# Altium footprint library 6-Connectors-1.PcbLib: 54 footprints (part 4 of 5)
Each footprint in its own frame and in the unit in brackets; x right, y up, seen from the top. Pads: shape width x height; smd on the part's side, far side on the other; paste and mask are expansions set on the pad; w line width, h text height; cw(c..) or ccw(c..) is an arc to the next point about the centre after c.
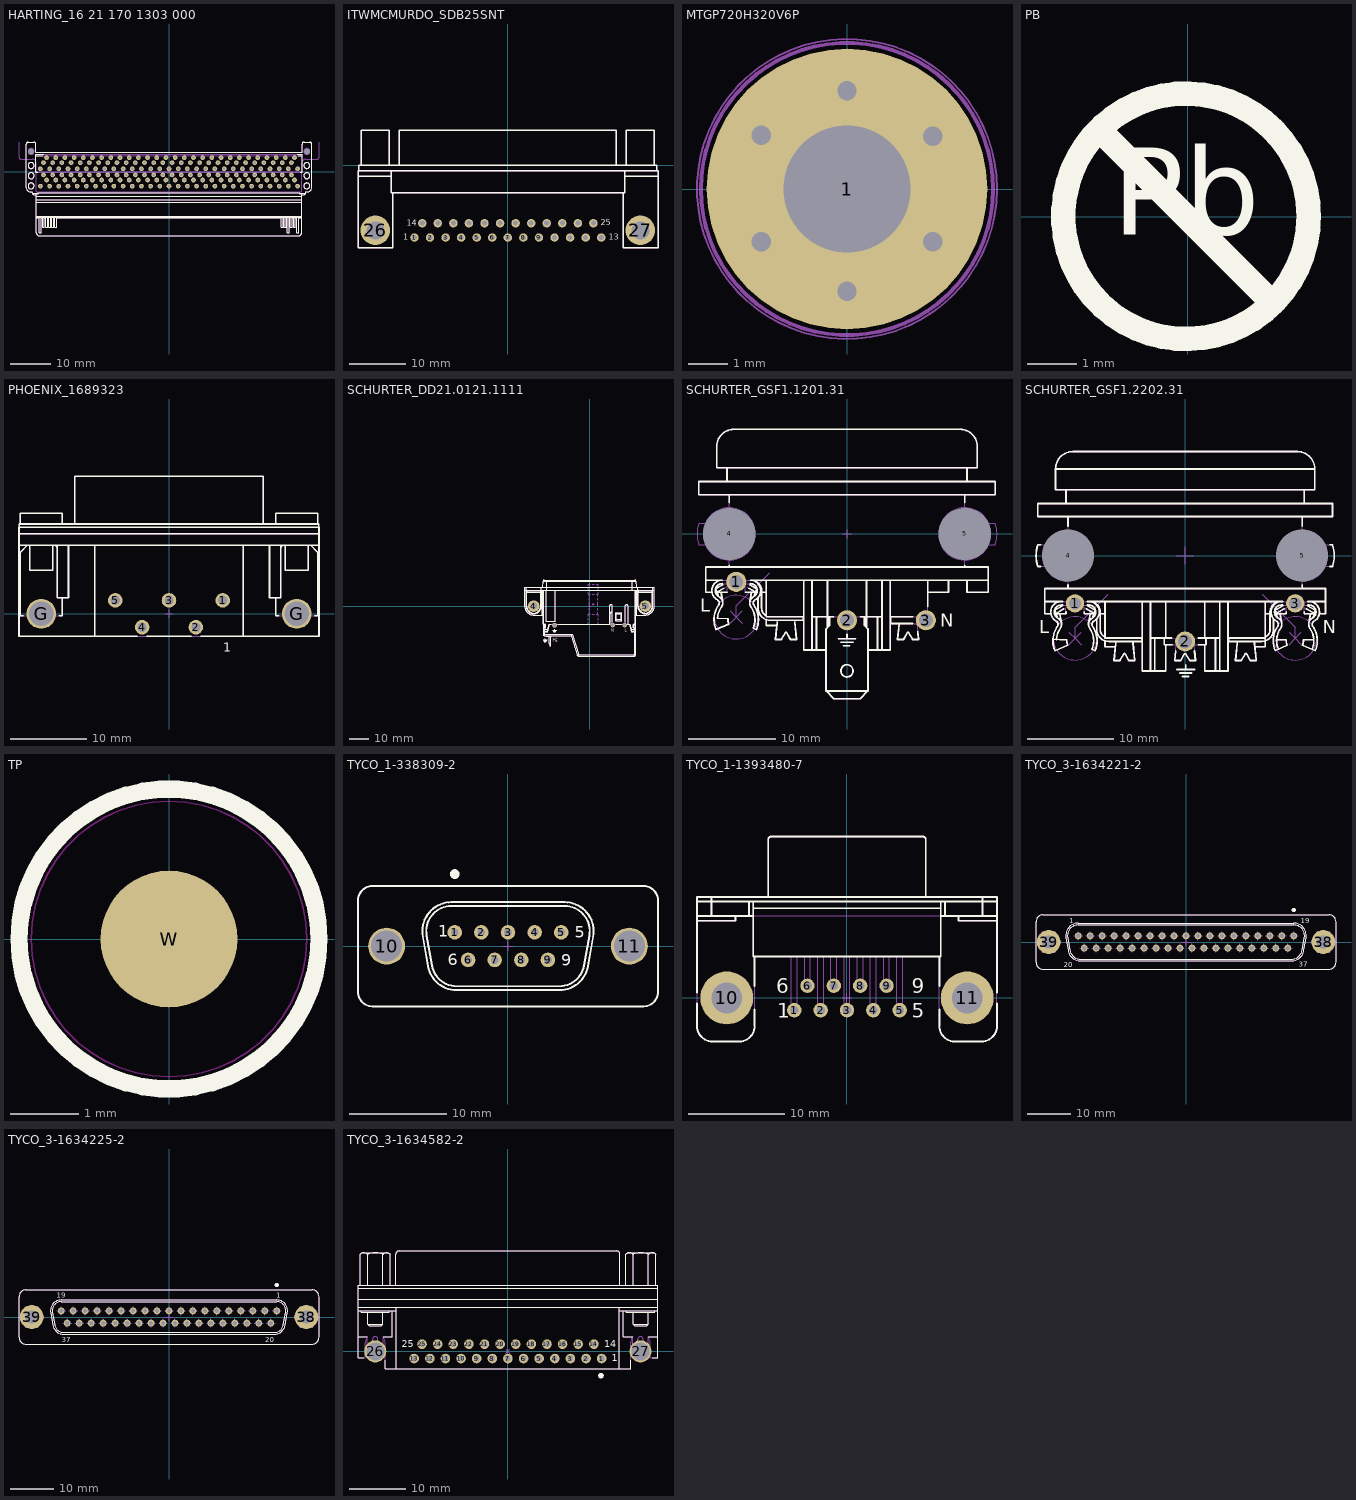
[diagram p3: the footprints below, top view; thin cyan lines are the x and y axes]

## HARTING_16 21 170 1303 000 [mm] "170 Poles, Extended Side, AdvancedMC-Plug-Connector"
height 2.44
pads (172):
  round 1.15 hole 0.55: 1(-31.5,-3.5) 2(-30.75,-0.75) 3(-30,-2) 4(-29.25,-3.5) 5(-28.5,-0.75) 6(-27.75,-2) 7(-27,-3.5) 8(-26.25,-0.75) 9(-25.5,-2) 10(-24.75,-3.5) 11(-24,-0.75) 12(-23.25,-2) 13(-22.5,-3.5) 14(-21.75,-0.75) 15(-21,-2) 16(-20.25,-3.5) 17(-19.5,-0.75) 18(-18.75,-2) 19(-18,-3.5) 20(-17.25,-0.75) 21(-16.5,-2) 22(-15.75,-3.5) 23(-15,-0.75) 24(-14.25,-2) 25(-13.5,-3.5) 26(-12.75,-0.75) 27(-12,-2) 28(-11.25,-3.5) 29(-10.5,-0.75) 30(-9.75,-2) 31(-9,-3.5) 32(-8.25,-0.75) 33(-7.5,-2) 34(-6.75,-3.5) 35(-6,-0.75) 36(-5.25,-2) 37(-4.5,-3.5) 38(-3.75,-0.75) 39(-3,-2) 40(-2.25,-3.5) 41(-1.5,-0.75) 42(-0.75,-2) 43(0,-3.5) 44(0.75,-0.75) 45(1.5,-2) 46(2.25,-3.5) 47(3,-0.75) 48(3.75,-2) 49(4.5,-3.5) 50(5.25,-0.75) 51(6,-2) 52(6.75,-3.5) 53(7.5,-0.75) 54(8.25,-2) 55(9,-3.5) 56(9.75,-0.75) 57(10.5,-2) 58(11.25,-3.5) 59(12,-0.75) 60(12.75,-2) 61(13.5,-3.5) 62(14.25,-0.75) 63(15,-2) 64(15.75,-3.5) 65(16.5,-0.75) 66(17.25,-2) 67(18,-3.5) 68(18.75,-0.75) 69(19.5,-2) 70(20.25,-3.5) 71(21,-0.75) 72(21.75,-2) 73(22.5,-3.5) 74(23.25,-0.75) 75(24,-2) 76(24.75,-3.5) 77(25.5,-0.75) 78(26.25,-2) 79(27,-3.5) 80(27.75,-0.75) 81(28.5,-2) 82(29.25,-3.5) 83(30,-0.75) 84(30.75,-2) 85(31.5,-3.5) 86(31.5,0.75) 87(30.75,3.5) 88(30,2.25) 89(29.25,0.75) 90(28.5,3.5) 91(27.75,2.25) 92(27,0.75) 93(26.25,3.5) 94(25.5,2.25) 95(24.75,0.75) 96(24,3.5) 97(23.25,2.25) 98(22.5,0.75) 99(21.75,3.5) 100(21,2.25) 101(20.25,0.75) 102(19.5,3.5) 103(18.75,2.25) 104(18,0.75) 105(17.25,3.5) 106(16.5,2.25) 107(15.75,0.75) 108(15,3.5) 109(14.25,2.25) 110(13.5,0.75) 111(12.75,3.5) 112(12,2.25) 113(11.25,0.75) 114(10.5,3.5) 115(9.75,2.25) 116(9,0.75) 117(8.25,3.5) 118(7.5,2.25) 119(6.75,0.75) 120(6,3.5) 121(5.25,2.25) 122(4.5,0.75) 123(3.75,3.5) 124(3,2.25) 125(2.25,0.75) 126(1.5,3.5) 127(0.75,2.25) 128(0,0.75) 129(-0.75,3.5) 130(-1.5,2.25) 131(-2.25,0.75) 132(-3,3.5) 133(-3.75,2.25) 134(-4.5,0.75) 135(-5.25,3.5) 136(-6,2.25) 137(-6.75,0.75) 138(-7.5,3.5) 139(-8.25,2.25) 140(-9,0.75) 141(-9.75,3.5) 142(-10.5,2.25) 143(-11.25,0.75) 144(-12,3.5) 145(-12.75,2.25) 146(-13.5,0.75) 147(-14.25,3.5) 148(-15,2.25) 149(-15.75,0.75) 150(-16.5,3.5) 151(-17.25,2.25) 152(-18,0.75) 153(-18.75,3.5) 154(-19.5,2.25) 155(-20.25,0.75) 156(-21,3.5) 157(-21.75,2.25) 158(-22.5,0.75) 159(-23.25,3.5) 160(-24,2.25) 161(-24.75,0.75) 162(-25.5,3.5) 163(-26.25,2.25) 164(-27,0.75) 165(-27.75,3.5) 166(-28.5,2.25) 167(-29.25,0.75) 168(-30,3.5) 169(-30.75,2.25) 170(-31.5,0.75)
  round 1 hole 1.5 unplated mask+0.25: 171(-33.775,5) 172(33.775,5)
Top Overlay:
  circle w0.2: c33.775,1.55 r0.735
  circle w0.2: c33.775,-0.95 r0.735
  circle w0.2: c33.775,-3.45 r0.735
  circle w0.2: c-33.775,-3.45 r0.735
  circle w0.2: c-33.775,-0.95 r0.735
  circle w0.2: c-33.775,1.55 r0.735
  lines w0.2: -33.49,-5.2 -31.99,-5.2 ; -32.6,0.078 -32.307,0.078 ; -32.6,3.922 -30.961,3.922 ; -32.525,-11.2 -31.74,-11.2 ; -32.525,-11.068 32.525,-11.068 ; -32.525,-10.935 32.525,-10.935 ; -32.525,-7.4 32.525,-7.4 ; -32.525,-6.872 32.525,-6.872 ; -32.525,-6.009 32.525,-6.009 ; -32.525,-5.6 -33,-5.6 cw(c-33,-5.1) -33.5,-5.1 -33.5,-4.9 -33.95,-4.9 cw(c-33.95,-3.9) -34.95,-3.9 -34.95,6.8 cw(c-34.45,6.8) -34.45,7.3 -33.1,7.3 cw(c-33.1,6.8) -32.6,6.8 -32.6,4.8 32.6,4.8 32.6,6.8 cw(c33.1,6.8) 33.1,7.3 34.45,7.3 cw(c34.45,6.8) 34.95,6.8 34.95,-3.9 cw(c33.95,-3.9) 33.95,-4.9 33.5,-4.9 33.49,-5.2 31.99,-5.2 ; -32.18,-0.05 -32.6,-0.05 -32.6,4.3 -30.68,4.3 ; -31.74,-11.068 -31.74,-14.98 -31.26,-14.98 -31.26,-11.068 ; -31.26,-11.2 -30.99,-11.2 ; -30.99,-11.068 -30.99,-13.58 -30.51,-13.58 -30.51,-11.068 ; -30.51,-11.2 -30.24,-11.2 ; -30.24,-11.068 -30.24,-13.58 -29.76,-13.58 -29.76,-11.068 ; -29.76,-11.2 -29.49,-11.2 ; -29.49,-11.068 -29.49,-13.58 -29.01,-13.58 -29.01,-11.068 ; -29.01,-11.2 -28.74,-11.2 ; -28.74,-11.068 -28.74,-13.58 -28.26,-13.58 -28.26,-11.068 ; -28.26,-11.2 -27.99,-11.2 ; -27.99,-11.068 -27.99,-13.58 -27.51,-13.58 -27.51,-11.068 ; -27.51,-11.2 27.51,-11.2 ; 27.51,-11.068 27.51,-13.58 27.99,-13.58 27.99,-11.068 ; 27.99,-11.2 28.26,-11.2 ; 28.26,-11.068 28.26,-13.58 28.74,-13.58 28.74,-11.068 ; 28.74,-11.2 29.01,-11.2 ; 29.01,-11.068 29.01,-14.98 29.49,-14.98 29.49,-11.068 ; 29.49,-11.2 29.76,-11.2 ; 29.76,-11.068 29.76,-13.58 30.24,-13.58 30.24,-11.068 ; 30.24,-11.2 30.51,-11.2 ; 30.51,-11.068 30.51,-13.58 30.99,-13.58 30.99,-11.068 ; 30.99,-11.2 31.26,-11.2 ; 31.26,-11.068 31.26,-14.98 31.74,-14.98 31.74,-11.068 ; 31.43,4.3 32.6,4.3 32.6,-0.05 32.18,-0.05 ; 31.711,3.922 32.6,3.922 ; 31.74,-11.2 32.525,-11.2 ; 32.026,-15.594 32.379,-15.246 ccw(c32.025,-14.893) 32.525,-14.893 32.525,-5.377 ; 32.049,-15.574 cw(c31.718,-15.2) 31.718,-15.7 -31.718,-15.7 cw(c-31.718,-15.2) -32.026,-15.594 -32.379,-15.246 cw(c-32.025,-14.893) -32.525,-14.893 -32.525,-5.377 -31.99,-5.359 -31.99,-5.093 31.99,-5.093 31.99,-5.359 32.525,-5.359 ; 32.308,0.079 32.6,0.079 ; 32.525,-5.6 33,-5.6 ccw(c33,-5.1) 33.5,-5.1
Mechanical 8:
  drawing of 704 lines, arcs and shapes, not listed
  text "PCB Edge" at -5.225,-7 h1.52
Mechanical 14:
  circle w0.1: c33.775,5 r0.735
  circle w0.1: c-33.775,5 r0.735
  circle w0.1: c33.775,1.55 r0.735
  circle w0.1: c33.775,-0.95 r0.735
  circle w0.1: c33.775,-3.45 r0.735
  circle w0.1: c-33.775,-3.45 r0.735
  circle w0.1: c-33.775,-0.95 r0.735
  circle w0.1: c-33.775,1.55 r0.735
  lines w0.1: -33.49,-5.2 -31.99,-5.2 ; -32.6,0.078 32.6,0.079 ; -32.6,3.922 32.6,3.922 ; -32.525,-11.2 -31.74,-11.2 ; -32.525,-11.068 32.525,-11.068 ; -32.525,-10.935 32.525,-10.935 ; -32.525,-7.4 32.525,-7.4 ; -32.525,-6.872 32.525,-6.872 ; -32.525,-6.009 32.525,-6.009 ; -32.525,-5.6 -33,-5.6 cw(c-33,-5.1) -33.5,-5.1 -33.5,-4.9 -33.95,-4.9 cw(c-33.95,-3.9) -34.95,-3.9 -34.95,6.8 cw(c-34.45,6.8) -34.45,7.3 -33.1,7.3 cw(c-33.1,6.8) -32.6,6.8 -32.6,4.8 32.6,4.8 32.6,6.8 cw(c33.1,6.8) 33.1,7.3 34.45,7.3 cw(c34.45,6.8) 34.95,6.8 34.95,-3.9 cw(c33.95,-3.9) 33.95,-4.9 33.5,-4.9 33.49,-5.2 31.99,-5.2 ; -31.74,-11.068 -31.74,-14.98 -31.26,-14.98 -31.26,-11.068 ; -31.26,-11.2 -30.99,-11.2 ; -30.99,-11.068 -30.99,-13.58 -30.51,-13.58 -30.51,-11.068 ; -30.51,-11.2 -30.24,-11.2 ; -30.24,-11.068 -30.24,-13.58 -29.76,-13.58 -29.76,-11.068 ; -29.76,-11.2 -29.49,-11.2 ; -29.49,-11.068 -29.49,-13.58 -29.01,-13.58 -29.01,-11.068 ; -29.01,-11.2 -28.74,-11.2 ; -28.74,-11.068 -28.74,-13.58 -28.26,-13.58 -28.26,-11.068 ; -28.26,-11.2 -27.99,-11.2 ; -27.99,-11.068 -27.99,-13.58 -27.51,-13.58 -27.51,-11.068 ; -27.51,-11.2 27.51,-11.2 ; 27.51,-11.068 27.51,-13.58 27.99,-13.58 27.99,-11.068 ; 27.99,-11.2 28.26,-11.2 ; 28.26,-11.068 28.26,-13.58 28.74,-13.58 28.74,-11.068 ; 28.74,-11.2 29.01,-11.2 ; 29.01,-11.068 29.01,-14.98 29.49,-14.98 29.49,-11.068 ; 29.49,-11.2 29.76,-11.2 ; 29.76,-11.068 29.76,-13.58 30.24,-13.58 30.24,-11.068 ; 30.24,-11.2 30.51,-11.2 ; 30.51,-11.068 30.51,-13.58 30.99,-13.58 30.99,-11.068 ; 30.99,-11.2 31.26,-11.2 ; 31.26,-11.068 31.26,-14.98 31.74,-14.98 31.74,-11.068 ; 31.74,-11.2 32.525,-11.2 ; 32.026,-15.594 32.379,-15.246 ccw(c32.025,-14.893) 32.525,-14.893 32.525,-5.377 ; 32.049,-15.574 cw(c31.718,-15.2) 31.718,-15.7 -31.718,-15.7 cw(c-31.718,-15.2) -32.026,-15.594 -32.379,-15.246 cw(c-32.025,-14.893) -32.525,-14.893 -32.525,-5.377 -31.99,-5.359 -31.99,-5.093 31.99,-5.093 31.99,-5.359 32.525,-5.359 ; 32.525,-5.6 33,-5.6 ccw(c33,-5.1) 33.5,-5.1 ; -32.6,-0.05 -32.6,4.3 32.6,4.3 32.6,-0.05 -32.6,-0.05
3D body "HARTING_16 21 170 1303 000.stp": height 2.42, standoff -2.18, extent -34.95,-15.7 34.95,7.3

## ITWMCMURDO_SDB25SNT [mm] "25 Way Right Angled Female D-sub Connector"
height 12.5
pads (27):
  round 1.5 hole 0.9: 1(-16.56,-12.84) 2(-13.8,-12.84) 3(-11.04,-12.84) 4(-8.28,-12.84) 5(-5.52,-12.84) 6(-2.76,-12.84) 7(0,-12.84) 8(2.76,-12.84) 9(5.52,-12.84) 10(8.28,-12.84) 11(11.04,-12.84) 12(13.8,-12.84) 13(16.56,-12.84) 14(-15.18,-10.3) 15(-12.42,-10.3) 16(-9.66,-10.3) 17(-6.9,-10.3) 18(-4.14,-10.3) 19(-1.38,-10.3) 20(1.38,-10.3) 21(4.14,-10.3) 22(6.9,-10.3) 23(9.66,-10.3) 24(12.42,-10.3) 25(15.18,-10.3)
  round 5.25 hole 3.2: 26(-23.5,-11.57) 27(23.5,-11.57)
Top Overlay:
  lines w0.254: -26.571,-2 -20.671,-2 ; -26.45,-1 -26.45,0 26.45,0 26.45,-1 ; -26,0 -26,6.2 -21,6.2 -21,0 ; -20.671,-1 -20.671,-4.9 20.729,-4.9 20.729,-1 ; -20.371,-4.9 -20.371,-14.67 -26.571,-14.67 -26.571,-1 26.629,-1 26.629,-14.67 20.429,-14.67 20.429,-4.9 ; -19.25,0 -19.25,6.2 19.25,6.2 19.25,0 ; 20.729,-2 26.629,-2 ; 21,0 21,6.2 26,6.2 26,0
  text "1" at -18.542,-13.208 h1.02
  text "13" at 17.907,-13.208 h1.02
  text "14" at -17.907,-10.795 h1.02
  text "25" at 16.51,-10.668 h1.02
Mechanical 14:
  lines w0.1: -26.571,-2 -20.671,-2 ; -26.45,-1 -26.45,0 26.45,0 26.45,-1 ; -26,0 -26,6.2 -21,6.2 -21,0 ; -20.671,-1 -20.671,-4.9 20.729,-4.9 20.729,-1 ; -20.371,-4.9 -20.371,-14.67 -26.571,-14.67 -26.571,-1 26.629,-1 26.629,-14.67 20.429,-14.67 20.429,-4.9 ; -19.25,0 -19.25,6.2 19.25,6.2 19.25,0 ; 20.729,-2 26.629,-2 ; 21,0 21,6.2 26,6.2 26,0
  text "1" at -18.542,-13.208 h1.02
  text "13" at 17.907,-13.208 h1.02
  text "14" at -17.907,-10.795 h1.02
  text "25" at 16.51,-10.668 h1.02
3D body "v160-080.stp": height 0.02, standoff -1.65, extent 14.38,-11.1 15.98,-9.5
3D body "v160-080.stp": height 0.02, standoff -1.65, extent 15.76,-13.64 17.36,-12.04
3D body "v160-080.stp": height 0.02, standoff -1.65, extent 13,-13.64 14.6,-12.04
3D body "v160-080.stp": height 0.02, standoff -1.65, extent 11.62,-11.1 13.22,-9.5
3D body "v160-080.stp": height 0.02, standoff -1.65, extent 10.24,-13.64 11.84,-12.04
3D body "v160-080.stp": height 0.02, standoff -1.65, extent 8.86,-11.1 10.46,-9.5
3D body "v160-080.stp": height 0.02, standoff -1.65, extent 7.48,-13.64 9.08,-12.04
3D body "v160-080.stp": height 0.02, standoff -1.65, extent 6.1,-11.1 7.7,-9.5
3D body "v160-080.stp": height 0.02, standoff -1.65, extent 4.72,-13.64 6.32,-12.04
3D body "v160-080.stp": height 0.02, standoff -1.65, extent 3.34,-11.1 4.94,-9.5
3D body "v160-080.stp": height 0.02, standoff -1.65, extent 1.96,-13.64 3.56,-12.04
3D body "v160-080.stp": height 0.02, standoff -1.65, extent 0.58,-11.1 2.18,-9.5
3D body "v160-080.stp": height 0.02, standoff -1.65, extent -0.8,-13.64 0.8,-12.04
3D body "v160-080.stp": height 0.02, standoff -1.65, extent -2.18,-11.1 -0.58,-9.5
3D body "v160-080.stp": height 0.02, standoff -1.65, extent -3.56,-13.64 -1.96,-12.04
3D body "v160-080.stp": height 0.02, standoff -1.65, extent -4.94,-11.1 -3.34,-9.5
3D body "v160-080.stp": height 0.02, standoff -1.65, extent -6.32,-13.64 -4.72,-12.04
3D body "v160-080.stp": height 0.02, standoff -1.65, extent -7.7,-11.1 -6.1,-9.5
3D body "v160-080.stp": height 0.02, standoff -1.65, extent -9.08,-13.64 -7.48,-12.04
3D body "v160-080.stp": height 0.02, standoff -1.65, extent -10.46,-11.1 -8.86,-9.5
3D body "v160-080.stp": height 0.02, standoff -1.65, extent -13.22,-11.1 -11.62,-9.5
3D body "v160-080.stp": height 0.02, standoff -1.65, extent -11.84,-13.64 -10.24,-12.04
3D body "v160-080.stp": height 0.02, standoff -1.65, extent -14.6,-13.64 -13,-12.04
3D body "v160-080.stp": height 0.02, standoff -1.65, extent -17.36,-13.64 -15.76,-12.04
3D body "v160-080.stp": height 0.02, standoff -1.65, extent -15.98,-11.1 -14.38,-9.5
3D body "ITWMCMURDO_SDB25SNT.stp": height 12.93, standoff -5, extent -26.71,-14.67 26.71,6.2

## MTGP720H320V6P [mm]
pads (1):
  round 7.2 hole 3.25: 1(0,0)
via -2.2,-1.35 diameter 1 hole 0.5
via -2.2,1.375 diameter 1 hole 0.5
via 0,2.525 diameter 1 hole 0.5
via 2.2,1.35 diameter 1 hole 0.5
via 0,-2.625 diameter 1 hole 0.5
via 2.2,-1.35 diameter 1 hole 0.5
Mechanical 8:
  circle w0.1: c0,0 r2.6
  circle w0.1: c0,0 r3.75
  lines w0.1: -2.657,1.625 -2.224,1.375 ; -2.632,-1.6 -2.199,-1.35 ; -2.474,0.942 -2.224,1.375 ; -2.449,-0.917 -2.199,-1.35 ; -1.974,1.808 -2.224,1.375 ; -1.949,-1.783 -2.199,-1.35 ; -1.791,1.125 -2.224,1.375 ; -1.766,-1.1 -2.199,-1.35 ; -0.5,-2.625 0,-2.625 ; -0.5,0 0,0 ; -0.5,2.525 0,2.525 ; 0,-3.125 0,-2.625 ; 0,-2.125 0,-2.625 ; 0,-0.5 0,0 ; 0,0.5 0,0 ; 0,2.025 0,2.525 ; 0,3.025 0,2.525 ; 0.5,-2.625 0,-2.625 ; 0.5,0 0,0 ; 0.5,2.525 0,2.525 ; 1.766,-1.1 2.199,-1.35 ; 1.766,1.1 2.199,1.35 ; 1.949,-1.783 2.199,-1.35 ; 1.949,1.783 2.199,1.35 ; 2.449,-0.917 2.199,-1.35 ; 2.449,0.917 2.199,1.35 ; 2.632,-1.6 2.199,-1.35 ; 2.632,1.6 2.199,1.35
Mechanical 14:
  circle w0.1: c0,0 r3.75
Mechanical 15:
  circle w0.05: c0,0 r3.85
3D body "mtgp720h320v6p.stp": height 0.1, standoff -1.75, extent -3.627,-3.627 3.628,3.628

## PB [mm]
Top Overlay:
  circle w0.5: c-0.031,0.013 r2.5
  lines w0.5: -1.737,1.719 1.675,-1.693
  text "Pb" at -1.536,-0.948 h3.05
3D body "pb.stp": height 0.02, standoff 0, extent -2.725,-2.725 2.725,2.725

## PHOENIX_1689323 [mm] "Pitch 3.5mm, 5-Positions POWER-SUBCON Shielded Header, With Capacitive  Ground Connection"
height 13.7
pads (7):
  round 1.9 hole 1.2: 1(7,1.75) 2(3.5,-1.75) 3(0,1.75) 4(-3.5,-1.75) 5(-7,1.75)
  round 3.9 hole 3.2: G(-16.65,0) G(16.65,0)
Top Overlay:
  lines w0.2: -19.55,8.95 19.55,8.95 ; -19.55,10.45 19.55,10.45 ; -19.54,11.25 -19.54,11.7 19.54,11.7 19.54,11.25 ; -19.4,11.7 -19.4,13.105 -13.9,13.105 -13.9,11.7 ; -18.984,-0.275 -19.4,-0.275 -19.4,8 -18.45,8.95 ; -18.15,8.95 -18.15,5.7 -15.15,5.7 -15.15,8.95 ; -14.85,8.95 -14.55,8.65 ; -14.55,8.95 -14.55,2.1 -13.1,2.1 -13.1,8.95 ; -14.316,-0.275 -13.9,-0.275 -13.9,2.1 ; -12.299,11.7 -12.299,17.9 ; -12.26,17.9 12.299,17.9 12.299,11.7 ; -9.7,-2.95 -9.7,8.95 ; -4.118,-2.95 -19.55,-2.95 -19.55,11.25 19.55,11.25 19.55,-2.95 4.118,-2.95 ; -2.882,-2.95 2.882,-2.95 ; 9.7,-2.95 9.7,8.95 ; 13.1,8.95 13.1,2.1 14.55,2.1 14.55,8.95 ; 13.9,2.1 13.9,-0.275 14.316,-0.275 ; 13.9,11.7 13.9,13.105 19.4,13.105 19.4,11.7 ; 14.55,8.65 14.85,8.95 ; 15.15,8.95 15.15,5.7 18.15,5.7 18.15,8.95 ; 18.45,8.95 19.4,8 19.4,-0.275 18.984,-0.275
  text "1" at 7.05,-4.925 h1.2
Mechanical 8:
  lines w0.1: -17.15,0 -16.65,0 ; -16.65,-0.5 -16.65,0 ; -16.65,0.5 -16.65,0 ; -16.15,0 -16.65,0 ; -7.5,1.75 -7,1.75 ; -7,1.25 -7,1.75 ; -7,2.25 -7,1.75 ; -6.5,1.75 -7,1.75 ; -4,-1.75 -3.5,-1.75 ; -3.5,-2.25 -3.5,-1.75 ; -3.5,-1.25 -3.5,-1.75 ; -3,-1.75 -3.5,-1.75 ; -0.5,0 0,0 ; -0.5,1.75 0,1.75 ; 0,-0.5 0,0 ; 0,0.5 0,0 ; 0,1.25 0,1.75 ; 0,2.25 0,1.75 ; 0.5,0 0,0 ; 0.5,1.75 0,1.75 ; 3,-1.75 3.5,-1.75 ; 3.5,-2.25 3.5,-1.75 ; 3.5,-1.25 3.5,-1.75 ; 4,-1.75 3.5,-1.75 ; 6.5,1.75 7,1.75 ; 7,1.25 7,1.75 ; 7,2.25 7,1.75 ; 7.5,1.75 7,1.75 ; 16.15,0 16.65,0 ; 16.65,-0.5 16.65,0 ; 16.65,0.5 16.65,0 ; 17.15,0 16.65,0
Mechanical 14:
  lines w0.1: -19.55,8.95 19.55,8.95 ; -19.55,10.45 19.55,10.45 ; -19.54,11.25 -19.54,11.7 19.54,11.7 19.54,11.25 ; -19.4,11.7 -19.4,13.105 -13.9,13.105 -13.9,11.7 ; -18.45,8.95 -19.4,8 -19.4,-0.275 -13.9,-0.275 -13.9,2.1 ; -18.15,8.95 -18.15,5.7 -15.15,5.7 -15.15,8.95 ; -14.85,8.95 -14.55,8.65 ; -14.55,8.95 -14.55,2.1 -13.1,2.1 -13.1,8.95 ; -12.299,11.7 -12.299,17.9 ; -12.26,17.9 12.299,17.9 12.299,11.7 ; -9.7,-2.95 -9.7,8.95 ; 9.7,-2.95 9.7,8.95 ; 13.1,8.95 13.1,2.1 14.55,2.1 14.55,8.95 ; 13.9,2.1 13.9,-0.275 19.4,-0.275 19.4,8 18.45,8.95 ; 13.9,11.7 13.9,13.105 19.4,13.105 19.4,11.7 ; 14.55,8.65 14.85,8.95 ; 15.15,8.95 15.15,5.7 18.15,5.7 18.15,8.95 ; -19.55,-2.95 19.55,-2.95 19.55,11.25 -19.55,11.25 -19.55,-2.95
  text "1" at 7.05,-4.925 h1.2
3D body "PHOENIX_1689323.stp": height 13.65, standoff -4.1, extent -19.55,-3.331 19.55,17.519

## SCHURTER_DD21.0121.1111 [mm] "IEC Appliance Inlet C14 with Line Switch 2-Pole, Fuseholder 2-Pole, for PCB Mounting"
height 32.3
pads (5):
  round 2.2 hole 1.5: 1(17.65,-9.55) 3(11.65,-9.55)
  round 2.4 hole 1.7: 2(-17.55,-9.55)
  round 5.8 hole 3.4: 4(-28,0)
  round 5.8 hole 3.4 unplated: 5(28,0)
Top Overlay:
  drawing of 222 lines, arcs and shapes, not listed
  text "L" at 17.578,-12.875 h1.5
  text "N" at 11.025,-12.95 h1.5
  text "PE" at -18.375,-17.975 h1.5
Mechanical 8:
  circle w0.1: c17.65,-9.55 r0.65
  circle w0.1: c11.65,-9.55 r0.65
  circle w0.1: c-17.55,-9.55 r0.8
  circle w0.1: c28,0 r1.8
  circle w0.1: c-28,0 r1.8
  lines w0.1: -28.5,0 -28,0 ; -28,-0.5 -28,0 ; -28,0.5 -28,0 ; -27.5,0 -28,0 ; -18.05,-9.55 -17.55,-9.55 ; -17.55,-10.05 -17.55,-9.55 ; -17.55,-9.05 -17.55,-9.55 ; -17.05,-9.55 -17.55,-9.55 ; -0.5,0 0,0 ; 0,-0.5 0,0 ; 0,0.5 0,0 ; 0.5,0 0,0 ; 1.45,0.95 1.95,0.95 ; 1.95,0.45 1.95,0.95 ; 1.95,1.45 1.95,0.95 ; 2.45,0.95 1.95,0.95 ; 11.15,-9.55 11.65,-9.55 ; 11.65,-10.05 11.65,-9.55 ; 11.65,-9.05 11.65,-9.55 ; 12.15,-9.55 11.65,-9.55 ; 17.15,-9.55 17.65,-9.55 ; 17.65,-10.05 17.65,-9.55 ; 17.65,-9.05 17.65,-9.55 ; 18.15,-9.55 17.65,-9.55 ; 27.5,0 28,0 ; 28,-0.5 28,0 ; 28,0.5 28,0 ; 28.5,0 28,0
Mechanical 14:
  drawing of 258 lines, arcs and shapes, not listed
  text "L" at 17.578,-12.875 h1.5
  text "N" at 11.025,-12.95 h1.5
  text "PE" at -18.375,-17.975 h1.5
3D body "SCHURTER_DD21.0121.1111.stp": height 32.25, standoff -4.5, extent -32.5,-25.1 32.5,13.45

## SCHURTER_GSF1.1201.31 [mm] "IEC Appliance Inlet C14 with Fuseholder 1 Pole"
height 24.45
pads (5):
  round 2.3 hole 1.6: 1(-12.7,-5.5) 2(0,-9.9) 3(9.05,-9.9)
  round 1 hole 6 unplated mask+2.5: 4(-13.5,0) 5(13.5,0)
Top Overlay:
  circle w0.2: c0,-15.7 r0.7
  lines w0.2: -16.2,-5.3 -14.3,-5.3 ccw(c-14.3,-6.5) -14.867,-7.558 cw(c-15.06,-7.92) -14.724,-8.155 ccw(c-12.35,-9.82) -15.244,-9.64 ccw(c-12.35,-9.82) -15.018,-10.957 -13.546,-10.33 cw(c-12.35,-9.82) -13.647,-9.727 -14.845,-9.662 cw(c-12.35,-9.82) -14.397,-8.385 ccw(c-15.06,-7.92) -14.678,-7.205 cw(c-14.3,-6.5) -14.3,-5.7 ; -15.483,-6.7 -16.2,-6.7 -16.2,-3.8 16.2,-3.8 16.2,-6.7 13.75,-6.7 13.75,-5.3 ; -15.075,-6.7 -13.75,-6.7 ; -14.842,-6.7 -14.769,-7.148 ; -14.447,-6.7 -14.286,-7.682 ; -14.26,-5.848 -15.052,-6.305 -14.857,-6.643 -14.124,-6.22 ; -13.75,6 -13.75,7.6 ; -13.5,-3.8 -13.5,-3.581 ; -13.5,3.581 -13.5,4.5 ; -11.65,-6.7 -10.325,-6.7 ; -11.271,-6.223 -10.543,-6.643 -10.348,-6.305 -11.151,-5.842 ; -11.114,-7.682 -10.953,-6.7 ; -11.1,-5.7 cw(c-11.1,-6.5) -10.722,-7.205 ccw(c-10.34,-7.92) -11.003,-8.385 cw(c-13.05,-9.82) -10.75,-10.8 -10.382,-10.957 ccw(c-13.05,-9.82) -10.676,-8.155 cw(c-10.34,-7.92) -10.533,-7.558 ccw(c-11.1,-6.5) -11.1,-5.3 16.2,-5.3 ; -11,-5.3 cw(c-11,-6.5) -9.8,-6.5 -9.8,-8.5 ccw(c-8.8,-8.5) -9.25,-9.393 ; -10.631,-7.148 -10.558,-6.7 ; -10.2,-7.294 -10.2,-8.5 ccw(c-8.8,-8.5) -8.8,-9.9 -5,-9.9 -5,-9.5 ; -9.8,-6.7 -9.25,-6.7 ; -9.25,-9.826 -9.25,-10.5 -8.04,-10.5 ; -9.25,-5.3 -9.25,-9.5 -4.95,-9.5 ; -8,-10.1 -8.2,-12.1 -7.52,-12.1 -7.087,-11.35 cw(c-7,-11.4) -6.913,-11.35 -6.48,-12.1 -5.8,-12.1 -6,-10.1 ; -4.95,-5.3 -4.95,-13.3 -2.4,-13.3 ; -4,-13.3 -4,-5.3 ; -4,-9.5 -1.549,-9.5 ; -3.5,-13.3 -3.5,-9.5 ; -2.25,-10.75 -2.25,-5.3 ; -2,-9.5 -2,-10.5 -2.4,-10.9 -2.4,-18 ; -1,-12.03 1,-12.03 ; -0.7,-12.43 0.7,-12.43 ; -0.4,-12.83 0.3,-12.83 ; 0,-12.03 0,-11.506 ; 1.549,-9.5 4,-9.5 ; 2,-9.5 2,-10.5 2.4,-10.9 2.4,-18 ; 2.25,-10.75 2.25,-5.3 ; 2.4,-13.3 4.95,-13.3 4.95,-5.3 ; 3.5,-13.3 3.5,-9.5 ; 4,-13.3 4,-5.3 ; 4.95,-9.5 7.518,-9.5 ; 5,-9.5 5,-10.28 7.518,-10.28 ; 5.982,-10.28 5.8,-12.1 6.48,-12.1 6.913,-11.35 cw(c7,-11.4) 7.087,-11.35 7.52,-12.1 8.2,-12.1 8.109,-11.19 ; 9.25,-8.331 9.25,-5.3 ; 9.25,-6.7 11.65,-6.7 11.65,-5.3 ; 13.5,-3.8 13.5,-3.581 ; 13.5,3.581 13.5,4.5 ; 13.75,6 13.75,7.6 ; -2.4,-18 -1.5,-18.9 1.5,-18.9 2.4,-18 ; -2.4,-18 2.4,-18 ; -17,4.5 17,4.5 17,6 -17,6 -17,4.5 ; -14.95,7.6 14.95,7.6 14.95,10 ccw(c12.95,10) 12.95,12 -12.95,12 ccw(c-12.95,10) -14.95,10 -14.95,7.6
  text "N" at 10.7,-10.65 h1.5
  text "L" at -16.822,-8.9 h1.5
Mechanical 8:
  circle w0.1: c13.5,0 r3
  circle w0.1: c-13.5,0 r3
  circle w0.1: c-12.7,-5.5 r0.8
  circle w0.1: c9.05,-9.9 r0.8
  circle w0.1: c0,-9.9 r0.8
  circle w0.1: c-12.7,-9.545 r2.5
  lines w0.1: -14,0 -13.5,0 ; -13.5,-0.5 -13.5,0 ; -13.5,0.5 -13.5,0 ; -13.407,-10.252 -12.7,-9.545 ; -13.407,-8.838 -12.7,-9.545 ; -13.2,-5.5 -12.7,-5.5 ; -13,0 -13.5,0 ; -12.7,-6 -12.7,-5.5 ; -12.7,-5 -12.7,-5.5 ; -12.2,-5.5 -12.7,-5.5 ; -11.993,-10.252 -12.7,-9.545 ; -11.993,-8.838 -12.7,-9.545 ; -8.875,-4.425 -12.7,-8.25 -12.7,-9.545 ; -0.5,-9.9 0,-9.9 ; -0.5,0 0,0 ; 0,-10.4 0,-9.9 ; 0,-9.4 0,-9.9 ; 0,-0.5 0,0 ; 0,0.5 0,0 ; 0.5,-9.9 0,-9.9 ; 0.5,0 0,0 ; 8.55,-9.9 9.05,-9.9 ; 9.05,-10.4 9.05,-9.9 ; 9.05,-9.4 9.05,-9.9 ; 9.55,-9.9 9.05,-9.9 ; 13,0 13.5,0 ; 13.5,-0.5 13.5,0 ; 13.5,0.5 13.5,0 ; 14,0 13.5,0
  text "Must be 2mm" at -5.075,-5.95 h1
  text "3D Fuse (5X20) Stand-off Heigh" at -11.525,-3.975 h1
Mechanical 14:
  circle w0.1: c0,-15.7 r0.7
  lines w0.1: -16.2,-5.3 16.2,-5.3 ; -16.175,-1.243 -16.985,-1.243 cw(c-13.5,0) -16.985,1.243 -16.175,1.243 ; -15.483,-6.7 -16.2,-6.7 -16.2,-3.8 16.2,-3.8 16.2,-6.7 13.75,-6.7 13.75,-5.3 ; -15.075,-6.7 -13.75,-6.7 -13.75,-6.004 ; -14.842,-6.7 -14.769,-7.148 ; -14.447,-6.7 -14.286,-7.682 ; -14.3,-5.3 ccw(c-14.3,-6.5) -14.867,-7.558 cw(c-15.06,-7.92) -14.724,-8.155 ccw(c-12.35,-9.82) -15.244,-9.64 ccw(c-12.35,-9.82) -15.018,-10.957 -13.546,-10.33 cw(c-12.35,-9.82) -13.647,-9.727 -14.845,-9.662 cw(c-12.35,-9.82) -14.397,-8.385 ccw(c-15.06,-7.92) -14.678,-7.205 cw(c-14.3,-6.5) -14.3,-5.7 -11.1,-5.7 cw(c-11.1,-6.5) -10.722,-7.205 ccw(c-10.34,-7.92) -11.003,-8.385 cw(c-13.05,-9.82) -10.75,-10.8 -10.382,-10.957 ccw(c-13.05,-9.82) -10.676,-8.155 cw(c-10.34,-7.92) -10.533,-7.558 ccw(c-11.1,-6.5) -11.1,-5.3 ; -14.003,-5.7 -15.052,-6.305 -14.857,-6.643 -13.278,-5.732 cw(c-13.123,-6) -13.201,-5.7 ; -13.75,6 -13.75,7.6 ; -13.5,-3.8 -13.5,4.5 ; -13.5,-2.95 cw(c-13.5,0) -13.5,2.95 ; -12.199,-5.7 cw(c-12.277,-6) -12.122,-5.732 -10.543,-6.643 -10.348,-6.305 -11.397,-5.7 ; -11.65,-6.004 -11.65,-6.7 -10.325,-6.7 ; -11.114,-7.682 -10.953,-6.7 ; -11,-5.3 cw(c-11,-6.5) -9.8,-6.5 -9.8,-8.5 ccw(c-8.8,-8.5) -9.25,-9.393 ; -10.631,-7.148 -10.558,-6.7 ; -10.2,-7.294 -10.2,-8.5 ccw(c-8.8,-8.5) -8.8,-9.9 -5,-9.9 -5,-9.5 ; -9.8,-6.7 -9.25,-6.7 ; -9.25,-9.826 -9.25,-10.5 -8.04,-10.5 ; -9.25,-5.3 -9.25,-9.5 -4.95,-9.5 ; -8,-10.1 -8.2,-12.1 -7.52,-12.1 -7.087,-11.35 cw(c-7,-11.4) -6.913,-11.35 -6.48,-12.1 -5.8,-12.1 -6,-10.1 ; -4.95,-5.3 -4.95,-13.3 -2.4,-13.3 ; -4,-13.3 -4,-5.3 ; -4,-9.5 4,-9.5 ; -3.5,-13.3 -3.5,-9.5 ; -2.25,-10.75 -2.25,-5.3 ; -2,-9.5 -2,-10.5 -2.4,-10.9 -2.4,-18 ; -1,-12.03 1,-12.03 ; -0.7,-12.43 0.7,-12.43 ; -0.4,-12.83 0.3,-12.83 ; 0,-12.03 0,-11.43 ; 2,-9.5 2,-10.5 2.4,-10.9 2.4,-18 ; 2.25,-10.75 2.25,-5.3 ; 2.4,-13.3 4.95,-13.3 4.95,-5.3 ; 3.5,-13.3 3.5,-9.5 ; 4,-13.3 4,-5.3 ; 4.95,-9.5 9,-9.5 9,-10.28 5,-10.28 5,-9.5 ; 5.982,-10.28 5.8,-12.1 6.48,-12.1 6.913,-11.35 cw(c7,-11.4) 7.087,-11.35 7.52,-12.1 8.2,-12.1 8.018,-10.28 ; 8.04,-10.5 9.25,-10.5 9.25,-5.3 ; 9.25,-10.28 9.7,-10.28 9.7,-9.5 9.25,-9.5 ; 9.25,-6.7 11.65,-6.7 11.65,-5.3 ; 13.5,-3.8 13.5,4.5 ; 13.5,-2.95 ccw(c13.5,0) 13.5,2.95 ; 13.75,6 13.75,7.6 ; 16.175,-1.243 16.985,-1.243 ccw(c13.5,0) 16.985,1.243 16.175,1.243 ; -2.4,-18 -1.5,-18.9 1.5,-18.9 2.4,-18 ; -2.4,-18 2.4,-18 ; -17,4.5 17,4.5 17,6 -17,6 -17,4.5 ; -14.95,7.6 14.95,7.6 14.95,10 ccw(c12.95,10) 12.95,12 -12.95,12 ccw(c-12.95,10) -14.95,10 -14.95,7.6